# Altium footprint library CADTchip.PcbLib: 195 footprints (part 12 of 13)
Each footprint in its own frame and in the unit in brackets; x right, y up, seen from the top. Pads: shape width x height; smd on the part's side, far side on the other; paste and mask are expansions set on the pad; w line width, h text height; cw(c..) or ccw(c..) is an arc to the next point about the centre after c.
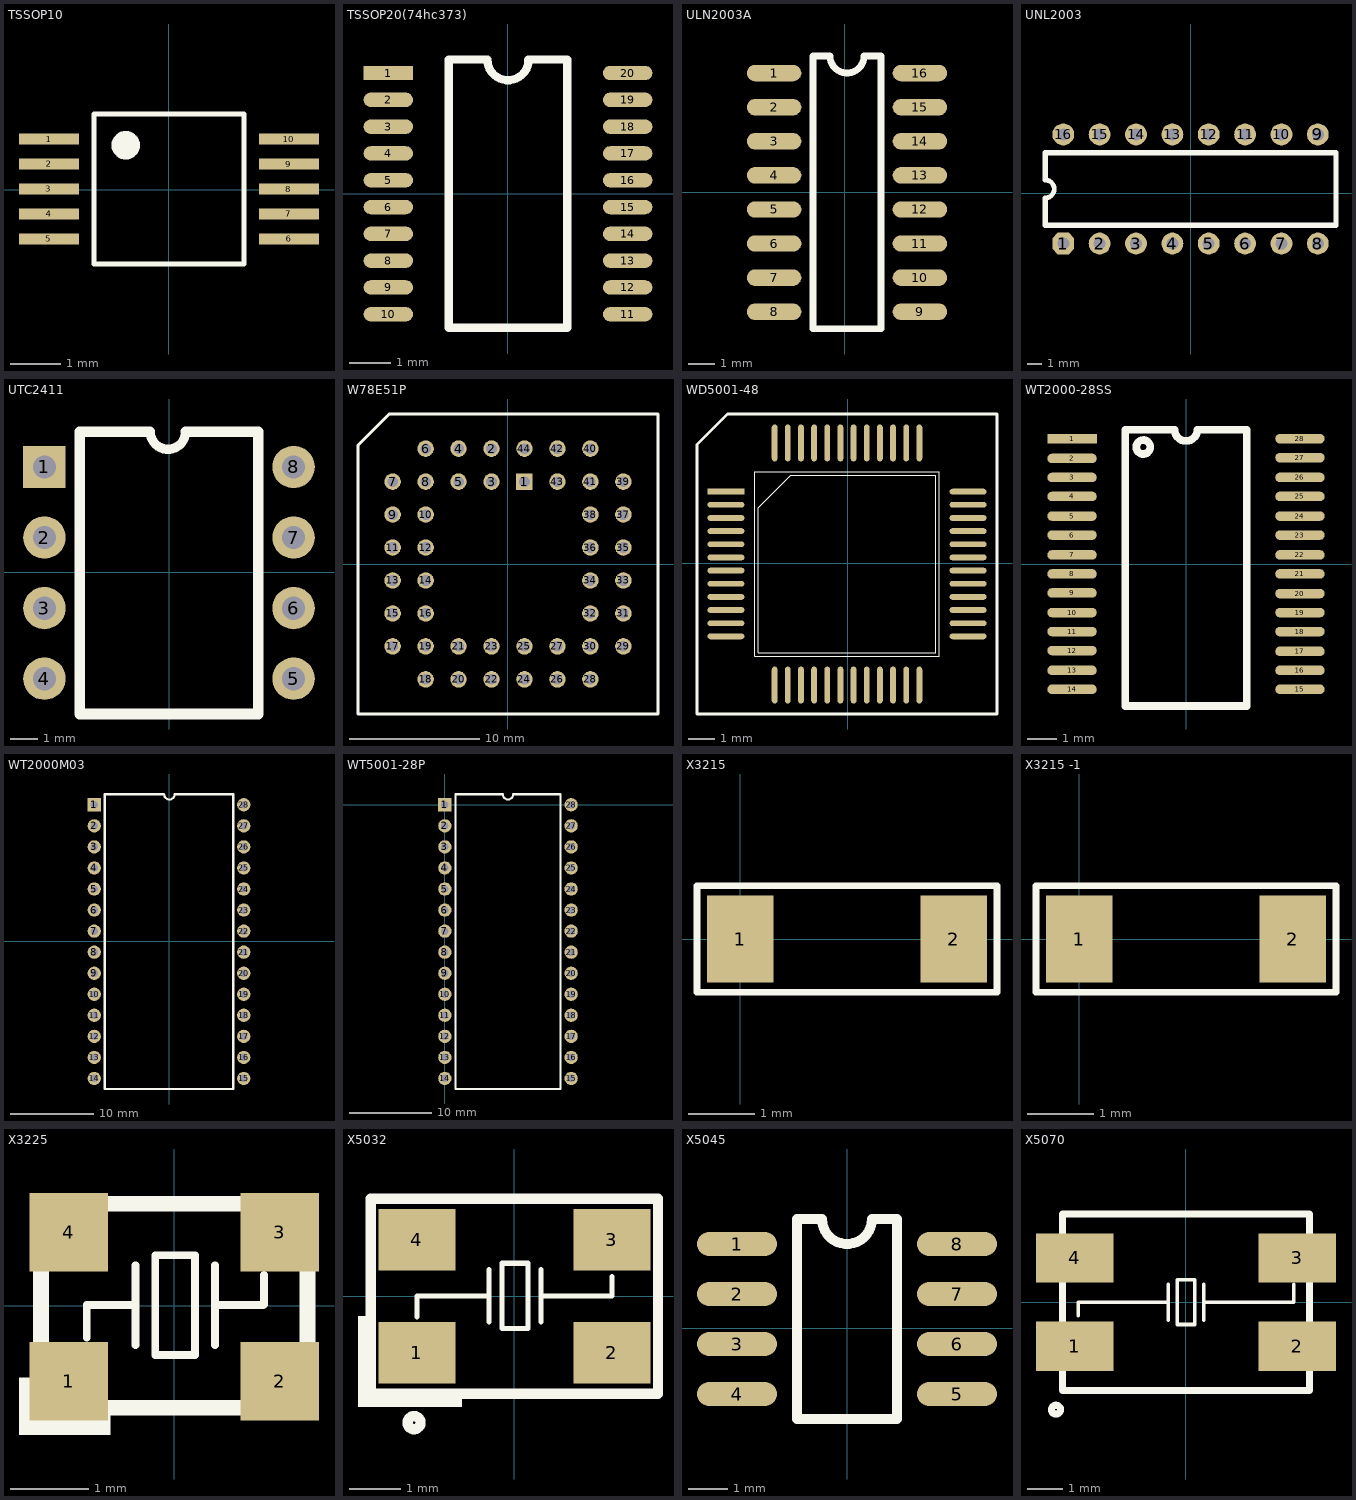
[diagram p11: the footprints below, top view; thin cyan lines are the x and y axes]

## TSSOP10 [mm]
pads (10):
  rect 1.2x0.22 smd: 1(-2.393,1.016) 2(-2.393,0.516) 3(-2.393,0.016) 4(-2.393,-0.484) 5(-2.393,-0.984) 6(2.407,-0.984) 7(2.407,-0.484) 8(2.407,0.016) 9(2.407,0.516) 10(2.407,1.016)
Top Overlay:
  circle w0.3: c-0.858,0.891 r0.135
  lines w0.1: -1.493,-1.484 -1.493,1.516 1.507,1.516 1.507,-1.484 -1.493,-1.484

## TSSOP20(74hc373) [mm] "74hc373"
pads (20):
  rect 1.2x0.35 smd: 1(-2.9,2.925)
  oval 1.2x0.35 smd: 2(-2.9,2.275) 3(-2.9,1.625) 4(-2.9,0.975) 5(-2.9,0.325) 6(-2.9,-0.325) 7(-2.9,-0.975) 8(-2.9,-1.625) 9(-2.9,-2.275) 10(-2.9,-2.925) 11(2.9,-2.925) 12(2.9,-2.275) 13(2.9,-1.625) 14(2.9,-0.975) 15(2.9,-0.325) 16(2.9,0.325) 17(2.9,0.975) 18(2.9,1.625) 19(2.9,2.275) 20(2.9,2.925)
Top Overlay:
  lines w0.2: -0.506,3.245 -1.435,3.25 -1.435,-3.25 1.435,-3.25 1.435,3.25 0.489,3.245 ; -0.5,3.25 ccw(c0,3.25) 0.5,3.25
3D body: height 1.2, standoff 0, extent -3.351,-3.3 3.199,3.3

## ULN2003A [mil]
pads (16):
  oval 80x24 smd: 1(-104,175) 2(-104,125) 3(-104,75) 4(-104,25) 5(-104,-25) 6(-104,-75) 7(-104,-125) 8(-104,-175) 9(110,-175) 10(110,-125) 11(110,-75) 12(110,-25) 13(110,25) 14(110,75) 15(110,125) 16(110,175)
Top Overlay:
  lines w10: -47,-200 -47,200 -22,200 ccw(c3,200) 28,200 53,200 53,-200 -47,-200
3D body: height 68.9, standoff 0, extent -75.74,-195.85 81.74,197.85

## UNL2003 [mil]
pads (16):
  oct 60x60 hole 33: 1(-351,-139)
  round 60 hole 33: 2(-251,-139) 3(-151,-139) 4(-51,-139) 5(49,-139) 6(149,-139) 7(249,-139) 8(349,-139) 9(349,161) 10(249,161) 11(149,161) 12(49,161) 13(-51,161) 14(-151,161) 15(-251,161) 16(-351,161)
Top Overlay:
  lines w13: -401,-14 ccw(c-401,11) -401,36
  lines w15: -401,-14 -401,-89 399,-89 399,111 -401,111 -401,36

## UTC2411 [mil]
pads (8):
  rect 60x60 hole 33: 1(-177,149)
  round 60 hole 33: 2(-177,49) 3(-177,-51) 4(-177,-151) 5(176,-151) 6(176,-51) 7(176,49) 8(176,149)
Top Overlay:
  lines w13: -27,199 ccw(c-2,199) 23,199
  lines w15: -28,199 -127,199 -127,-201 126,-201 126,199 23,199
3D body: height 188.19, standoff -109.84, extent -152.84,-215.92 157,214

## W78E51P [mil]
pads (44):
  rect 50x50 hole 32: 1(51,250)
  round 50 hole 32: 2(-49,350) 3(-49,250) 4(-149,350) 5(-149,250) 6(-249,350) 7(-349,250) 8(-249,250) 9(-349,150) 10(-249,150) 11(-349,50) 12(-249,50) 13(-349,-50) 14(-249,-50) 15(-349,-150) 16(-249,-150) 17(-349,-250) 18(-249,-350) 19(-249,-250) 20(-149,-350) 21(-149,-250) 22(-49,-350) 23(-49,-250) 24(51,-350) 25(51,-250) 26(151,-350) 27(151,-250) 28(251,-350) 29(351,-250) 30(251,-250) 31(351,-150) 32(251,-150) 33(351,-50) 34(251,-50) 35(351,50) 36(251,50) 37(351,150) 38(251,150) 39(351,250) 40(251,350) 41(251,250) 42(151,350) 43(151,250) 44(51,350)
Top Overlay:
  lines w10: -454,-455 456,-455 456,455 -359,455 -454,360 -454,-455

## WD5001-48 [mm] "LQFP-48"
pads (48):
  rect 1.4x0.22 smd: 1(-4.625,2.725)
  oval 1.4x0.22 smd: 2(-4.625,2.225) 3(-4.625,1.725) 4(-4.625,1.225) 5(-4.625,0.725) 6(-4.625,0.225) 7(-4.625,-0.275) 8(-4.625,-0.775) 9(-4.625,-1.275) 10(-4.625,-1.775) 11(-4.625,-2.275) 12(-4.625,-2.775) 25(4.575,-2.775) 26(4.575,-2.275) 27(4.575,-1.775) 28(4.575,-1.275) 29(4.575,-0.775) 30(4.575,-0.275) 31(4.575,0.225) 32(4.575,0.725) 33(4.575,1.225) 34(4.575,1.725) 35(4.575,2.225) 36(4.575,2.725)
  oval 0.22x1.4 smd: 13(-2.775,-4.625) 14(-2.275,-4.625) 15(-1.775,-4.625) 16(-1.275,-4.625) 17(-0.775,-4.625) 18(-0.275,-4.625) 19(0.225,-4.625) 20(0.725,-4.625) 21(1.225,-4.625) 22(1.725,-4.625) 23(2.225,-4.625) 24(2.725,-4.625) 37(2.725,4.575) 38(2.225,4.575) 39(1.725,4.575) 40(1.225,4.575) 41(0.725,4.575) 42(0.225,4.575) 43(-0.275,4.575) 44(-0.775,4.575) 45(-1.275,4.575) 46(-1.775,4.575) 47(-2.275,4.575) 48(-2.775,4.575)
Top Overlay:
  lines w0.025: -3.525,-3.525 3.475,-3.525 3.475,3.475 -3.525,3.475 -3.525,3.4 -3.525,-0.025 -3.525,-3.525 ; -3.39,-3.39 -3.39,2.105 -2.155,3.34 3.34,3.34 3.34,-3.39 -3.39,-3.39
  lines w0.102: -5.725,-5.725 5.675,-5.725 5.675,5.675 -4.561,5.675 -5.725,4.511 -5.725,-5.725
3D body: height 1.45, standoff 0, extent -4.525,-4.53 4.475,4.47

## WT2000-28SS [mil]
pads (28):
  rect 65x12.5 smd: 1(-150,165)
  oval 65x12.5 smd: 2(-150,139) 3(-150,114) 4(-150,89) 5(-150,63) 6(-150,38) 7(-150,12) 8(-150,-13) 9(-150,-38) 10(-150,-64) 11(-150,-89) 12(-150,-114) 13(-150,-140) 14(-150,-165) 15(150,-165) 16(150,-140) 17(150,-115) 18(150,-89) 19(150,-64) 20(150,-39) 21(150,-13) 22(150,12) 23(150,38) 24(150,63) 25(150,89) 26(150,114) 27(150,140) 28(150,165)
Top Overlay:
  circle w10: c-56.22,154 r9.22
  lines w10: -80,-187 -80,177 -15,177 ccw(c0,177) 15,177 80,177 80,-187 -80,-187
3D body: height 78.74, standoff 9.84, extent -105.33,-210.69 103.33,202.69

## WT2000M03 [mm]
pads (28):
  rect 1.6x1.6 hole 0.9: 1(-9.042,16.434)
  round 1.6 hole 0.9: 2(-9.042,13.894) 3(-9.042,11.354) 4(-9.042,8.814) 5(-9.042,6.274) 6(-9.042,3.734) 7(-9.042,1.194) 8(-9.042,-1.346) 9(-9.042,-3.886) 10(-9.042,-6.426) 11(-9.042,-8.966) 12(-9.042,-11.506) 13(-9.042,-14.046) 14(-9.042,-16.586) 15(8.992,-16.586) 16(8.992,-14.046) 17(8.992,-11.506) 18(8.992,-8.966) 19(8.992,-6.426) 20(8.992,-3.886) 21(8.992,-1.346) 22(8.992,1.194) 23(8.992,3.734) 24(8.992,6.274) 25(8.992,8.814) 26(8.992,11.354) 27(8.992,13.894) 28(8.992,16.434)
Top Overlay:
  lines w0.254: -7.772,-17.856 7.722,-17.856 7.722,17.704 0.66,17.704 cw(c0.025,17.704) -0.61,17.704 -7.772,17.704 -7.772,-17.856
3D body: height 4.5, standoff 0, extent -7.425,-18.176 7.425,18.024

## WT5001-28P [mm] "DIP-28A"
pads (28):
  rect 1.6x1.6 hole 0.9: 1(0,0)
  round 1.6 hole 0.9: 2(0,-2.54) 3(0,-5.08) 4(0,-7.62) 5(0,-10.16) 6(0,-12.7) 7(0,-15.24) 8(0,-17.78) 9(0,-20.32) 10(0,-22.86) 11(0,-25.4) 12(0,-27.94) 13(0,-30.48) 14(0,-33.02) 15(15.24,-33.02) 16(15.24,-30.48) 17(15.24,-27.94) 18(15.24,-25.4) 19(15.24,-22.86) 20(15.24,-20.32) 21(15.24,-17.78) 22(15.24,-15.24) 23(15.24,-12.7) 24(15.24,-10.16) 25(15.24,-7.62) 26(15.24,-5.08) 27(15.24,-2.54) 28(15.24,0)
Top Overlay:
  lines w0.254: 1.27,-34.29 1.27,1.27 6.985,1.27 ccw(c7.62,1.27) 8.255,1.27 13.97,1.27 13.97,-34.29 1.27,-34.29

## X3215 [mm]
pads (2):
  rect 1x1.3 smd: 1(0,0) 2(3.2,0)
Top Overlay:
  lines w0.1: -0.65,-0.8 3.85,-0.8 3.85,0.8 -0.65,0.8 -0.65,-0.8
3D body: height 0.81, standoff 0, extent 0,-0.762 3.2,0.738

## X3215 -1 [mm]
pads (2):
  rect 1x1.3 smd: 1(0,0) 2(3.2,0)
Top Overlay:
  lines w0.1: -0.65,-0.8 -0.65,0.8 3.85,0.8 3.85,-0.8 -0.65,-0.8
3D body: height 0.81, standoff 0, extent 0.026,-0.787 3.226,0.713

## X3225 [mm]
pads (4):
  rect 1x1 smd: 1(-1.346,-0.965) 2(1.346,-0.965) 3(1.346,0.94) 4(-1.346,0.94)
Top Overlay:
  rectangle: -1.981,-1.651 -1.803,-0.914
  rectangle: -1.803,-1.651 -0.813,-1.397
  lines w0.1: -1.118,-0.406 -1.118,0.008 -0.496,0.008 ; -0.496,-0.5 -0.496,0.516 ; 0.52,-0.5 0.52,0.516 ; 0.52,0.008 1.135,0.008 1.143,0.016 ; 1.143,0.025 1.143,0.39 ; -0.242,-0.627 0.266,-0.627 0.266,-0.309 0.266,0.326 0.266,0.643 -0.242,0.643 -0.242,-0.627
  lines w0.2: -1.7,-1.3 -1.7,1.3 1.7,1.3 1.7,-1.3 -1.7,-1.3
3D body: height 0.72, standoff 0, extent -1.549,-1.281 1.651,1.219

## X5032 [mm]
pads (4):
  rect 1.5x1.2 smd: 1(-1.9,-1.1) 2(1.9,-1.1) 3(1.9,1.1) 4(-1.9,1.1)
Top Overlay:
  circle w0.2: c-1.956,-2.464 r0.127
  rectangle: -3.048,-2.159 -2.87,-0.381
  rectangle: -3.023,-2.159 -1.016,-1.905
  lines w0.1: -1.897,-0.406 -1.897,0.008 -0.496,0.008 ; -0.496,-0.5 -0.496,0.516 ; 0.52,-0.5 0.52,0.516 ; 0.52,0.008 1.902,0.008 1.905,0.016 1.905,0.381 ; -0.242,-0.627 0.266,-0.627 0.266,-0.309 0.266,0.326 0.266,0.643 -0.242,0.643 -0.242,-0.627
  lines w0.2: -2.8,-1.9 -2.8,1.9 2.8,1.9 2.8,-1.9 -2.8,-1.9
3D body: height 1, standoff 0, extent -2.5,-1.6 2.5,1.6

## X5045 [mil]
pads (8):
  oval 80x24 smd: 1(-110,84) 2(-110,34) 3(-110,-16) 4(-110,-66) 5(110,-66) 6(110,-16) 7(110,34) 8(110,84)
Top Overlay:
  lines w10: -50,-91 -50,109 -25,109 ccw(c0,109) 25,109 50,109 50,-91 -50,-91

## X5070 [mm]
pads (4):
  rect 2.2x1.4 smd: 1(-3.15,-1.25) 2(3.15,-1.25) 3(3.15,1.25) 4(-3.15,1.25)
Top Overlay:
  circle w0.2: c-3.683,-3.048 r0.127
  lines w0.1: -3.048,-0.381 -3.048,0 -0.508,0 ; -0.508,-0.508 -0.508,0.508 ; 0.508,-0.508 0.508,0.508 ; 0.508,0 3.048,0 3.048,0.508 ; -0.254,-0.635 0.254,-0.635 0.254,0.635 -0.254,0.635 -0.254,-0.635
  lines w0.2: -3.5,-2.5 -3.5,2.5 3.5,2.5 3.5,-2.5 -3.5,-2.5
3D body: height 1.31, standoff 0, extent -3.576,-2.54 3.424,2.46